# Altium integrated library Altium_WCAP-FTX2 (rev22a).IntLib: 106 symbols (part 2 of 2)
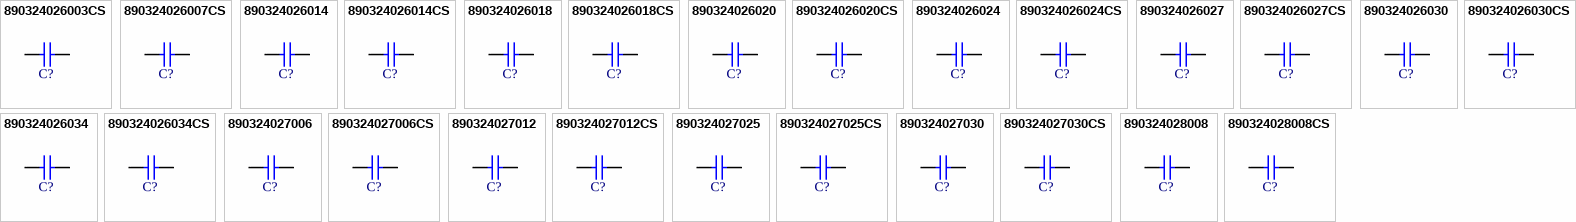
[diagram p3: symbols 890324026003CS to 890324028008CS]

## 890324027012CS
designator C?, comment 1.2uF  (value not drawn)
WCAP-FTX2 Film Capacitor, THT, L31W13H22mm, 1.2uF, 275VAC; Manufacturer: Wurth Elektronik; Manufacturer Part Number: 890324027012CS; Capacitance Tolerance: +/-10%; Dissipation Factor @1kHz: 0.1%; Dissipation Factor @10kHz: 0.7%; Insulation Resistance: 10000Ohm x F; Pitch: 27.5mm; Rate of Voltage Rise: 130V/us; Rated Voltage (AC): 275V; Technical Reference: MX2P275125K275ACPP36004; ComponentLink1Description: Manufacturer Link; ComponentLink1URL: https://www.we-online.com/redexpert/article/890324027012CS?ad; ComponentLink2Description: Datasheet; ComponentLink2URL: https://www.we-online.com/redexpert/spec/890324027012CS?ad; Category: Film Capacitors; Match Code: WCAP-FTX2; Mount: Through Hole; Operating Temperature Max: 105°C; Operating Temperature Min: -40°C; Packaging: Carton; Length: 31mm; Width: 13mm; Height: 22mm; Capacitance: 1.2uF
footprint WCAP-FTX2_L31W13H22_CS
pins: 1, 2

## 890324027025
designator C?, comment 3.3uF  (value not drawn)
WCAP-FTX2 Film Capacitor, THT, L31W15.5H29mm, 3.3uF, 275VAC; Manufacturer: Wurth Elektronik; Manufacturer Part Number: 890324027025; Capacitance Tolerance: +/-10%; Dissipation Factor @1kHz: 0.1%; Dissipation Factor @10kHz: 0.7%; Insulation Resistance: 10000Ohm x F; Pitch: 27.5mm; Rate of Voltage Rise: 130V/us; Rated Voltage (AC): 275V; Technical Reference: MX2P275335K275ASPB55000; ComponentLink1Description: Manufacturer Link; ComponentLink1URL: https://www.we-online.com/redexpert/article/890324027025?ad; ComponentLink2Description: Datasheet; ComponentLink2URL: https://www.we-online.com/redexpert/spec/890324027025?ad; Category: Film Capacitors; Match Code: WCAP-FTX2; Mount: Through Hole; Operating Temperature Max: 105°C; Operating Temperature Min: -40°C; Packaging: Carton; Length: 31mm; Width: 15.5mm; Height: 29mm; Capacitance: 3.3uF
footprint WCAP-FTX2_L31W15.5H29
pins: 1, 2

## 890324027025CS
designator C?, comment 3.3uF  (value not drawn)
WCAP-FTX2 Film Capacitor, THT, L31W15.5H29mm, 3.3uF, 275VAC; Manufacturer: Wurth Elektronik; Manufacturer Part Number: 890324027025CS; Capacitance Tolerance: +/-10%; Dissipation Factor @1kHz: 0.1%; Dissipation Factor @10kHz: 0.7%; Insulation Resistance: 10000Ohm x F; Pitch: 27.5mm; Rate of Voltage Rise: 130V/us; Rated Voltage (AC): 275V; Technical Reference: MX2P275335K275ACPP25004; ComponentLink1Description: Manufacturer Link; ComponentLink1URL: https://www.we-online.com/redexpert/article/890324027025CS?ad; ComponentLink2Description: Datasheet; ComponentLink2URL: https://www.we-online.com/redexpert/spec/890324027025CS?ad; Category: Film Capacitors; Match Code: WCAP-FTX2; Mount: Through Hole; Operating Temperature Max: 105°C; Operating Temperature Min: -40°C; Packaging: Carton; Length: 31mm; Width: 15.5mm; Height: 29mm; Capacitance: 3.3uF
footprint WCAP-FTX2_L31W15.5H29_CS
pins: 1, 2

## 890324027030
designator C?, comment 4.7uF  (value not drawn)
WCAP-FTX2 Film Capacitor, THT, L31W19H32.5mm, 4.7uF, 275VAC; Manufacturer: Wurth Elektronik; Manufacturer Part Number: 890324027030; Capacitance Tolerance: +/-10%; Dissipation Factor @1kHz: 0.1%; Dissipation Factor @10kHz: 0.7%; Insulation Resistance: 10000Ohm x F; Pitch: 27.5mm; Rate of Voltage Rise: 140V/us; Rated Voltage (AC): 275V; Technical Reference: MX2P275475K275ASPB56000; ComponentLink1Description: Manufacturer Link; ComponentLink1URL: https://www.we-online.com/redexpert/article/890324027030?ad; ComponentLink2Description: Datasheet; ComponentLink2URL: https://www.we-online.com/redexpert/spec/890324027030?ad; Category: Film Capacitors; Match Code: WCAP-FTX2; Mount: Through Hole; Operating Temperature Max: 105°C; Operating Temperature Min: -40°C; Packaging: Carton; Length: 31mm; Width: 19mm; Height: 32.5mm; Capacitance: 4.7uF
footprint WCAP-FTX2_L31W19H32.5
pins: 1, 2

## 890324027030CS
designator C?, comment 4.7uF  (value not drawn)
WCAP-FTX2 Film Capacitor, THT, L31W19H32.5mm, 4.7uF, 275VAC; Manufacturer: Wurth Elektronik; Manufacturer Part Number: 890324027030CS; Capacitance Tolerance: +/-10%; Dissipation Factor @1kHz: 0.1%; Dissipation Factor @10kHz: 0.7%; Insulation Resistance: 10000Ohm x F; Pitch: 27.5mm; Rate of Voltage Rise: 140V/us; Rated Voltage (AC): 275V; Technical Reference: MX2P275475K275ACPP26004; ComponentLink1Description: Manufacturer Link; ComponentLink1URL: https://www.we-online.com/redexpert/article/890324027030CS?ad; ComponentLink2Description: Datasheet; ComponentLink2URL: https://www.we-online.com/redexpert/spec/890324027030CS?ad; Category: Film Capacitors; Match Code: WCAP-FTX2; Mount: Through Hole; Operating Temperature Max: 105°C; Operating Temperature Min: -40°C; Packaging: Carton; Length: 31mm; Width: 19mm; Height: 32.5mm; Capacitance: 4.7uF
footprint WCAP-FTX2_L31W19H32.5_CS
pins: 1, 2

## 890324028008
designator C?, comment 6.8uF  (value not drawn)
WCAP-FTX2 Film Capacitor, THT, L41.5W22.5H35.5mm, 6.8uF, 275VAC; Manufacturer: Wurth Elektronik; Manufacturer Part Number: 890324028008; Capacitance Tolerance: +/-10%; Dissipation Factor @1kHz: 0.1%; Dissipation Factor @10kHz: 0.7%; Insulation Resistance: 10000Ohm x F; Pitch: 37.5mm; Rate of Voltage Rise: 110V/us; Rated Voltage (AC): 275V; Technical Reference: MX2P375685K275ASPB65000; ComponentLink1Description: Manufacturer Link; ComponentLink1URL: https://www.we-online.com/redexpert/article/890324028008?ad; ComponentLink2Description: Datasheet; ComponentLink2URL: https://www.we-online.com/redexpert/spec/890324028008?ad; Category: Film Capacitors; Match Code: WCAP-FTX2; Mount: Through Hole; Operating Temperature Max: 105°C; Operating Temperature Min: -40°C; Packaging: Carton; Length: 41.5mm; Width: 22.5mm; Height: 35.5mm; Capacitance: 6.8uF
footprint WCAP-FTX2_L41.5W22.5H35.5
pins: 1, 2

## 890324028008CS
designator C?, comment 6.8uF  (value not drawn)
WCAP-FTX2 Film Capacitor, THT, L41.5W22.5H35.5mm, 6.8uF, 275VAC; Manufacturer: Wurth Elektronik; Manufacturer Part Number: 890324028008CS; Capacitance Tolerance: +/-10%; Dissipation Factor @1kHz: 0.1%; Dissipation Factor @10kHz: 0.7%; Insulation Resistance: 10000Ohm x F; Pitch: 37.5mm; Rate of Voltage Rise: 110V/us; Rated Voltage (AC): 275V; Technical Reference: MX2P375685K275ACPP25004; ComponentLink1Description: Manufacturer Link; ComponentLink1URL: https://www.we-online.com/redexpert/article/890324028008CS?ad; ComponentLink2Description: Datasheet; ComponentLink2URL: https://www.we-online.com/redexpert/spec/890324028008CS?ad; Category: Film Capacitors; Match Code: WCAP-FTX2; Mount: Through Hole; Operating Temperature Max: 105°C; Operating Temperature Min: -40°C; Packaging: Carton; Length: 41.5mm; Width: 22.5mm; Height: 35.5mm; Capacitance: 6.8uF
footprint WCAP-FTX2_L41.5W22.5H35.5_CS
pins: 1, 2